# Altium footprint library 方林 封装库.PcbLib: 101 footprints (part 4 of 7)
Each footprint in its own frame and in the unit in brackets; x right, y up, seen from the top. Pads: shape width x height; smd on the part's side, far side on the other; paste and mask are expansions set on the pad; w line width, h text height; cw(c..) or ccw(c..) is an arc to the next point about the centre after c.
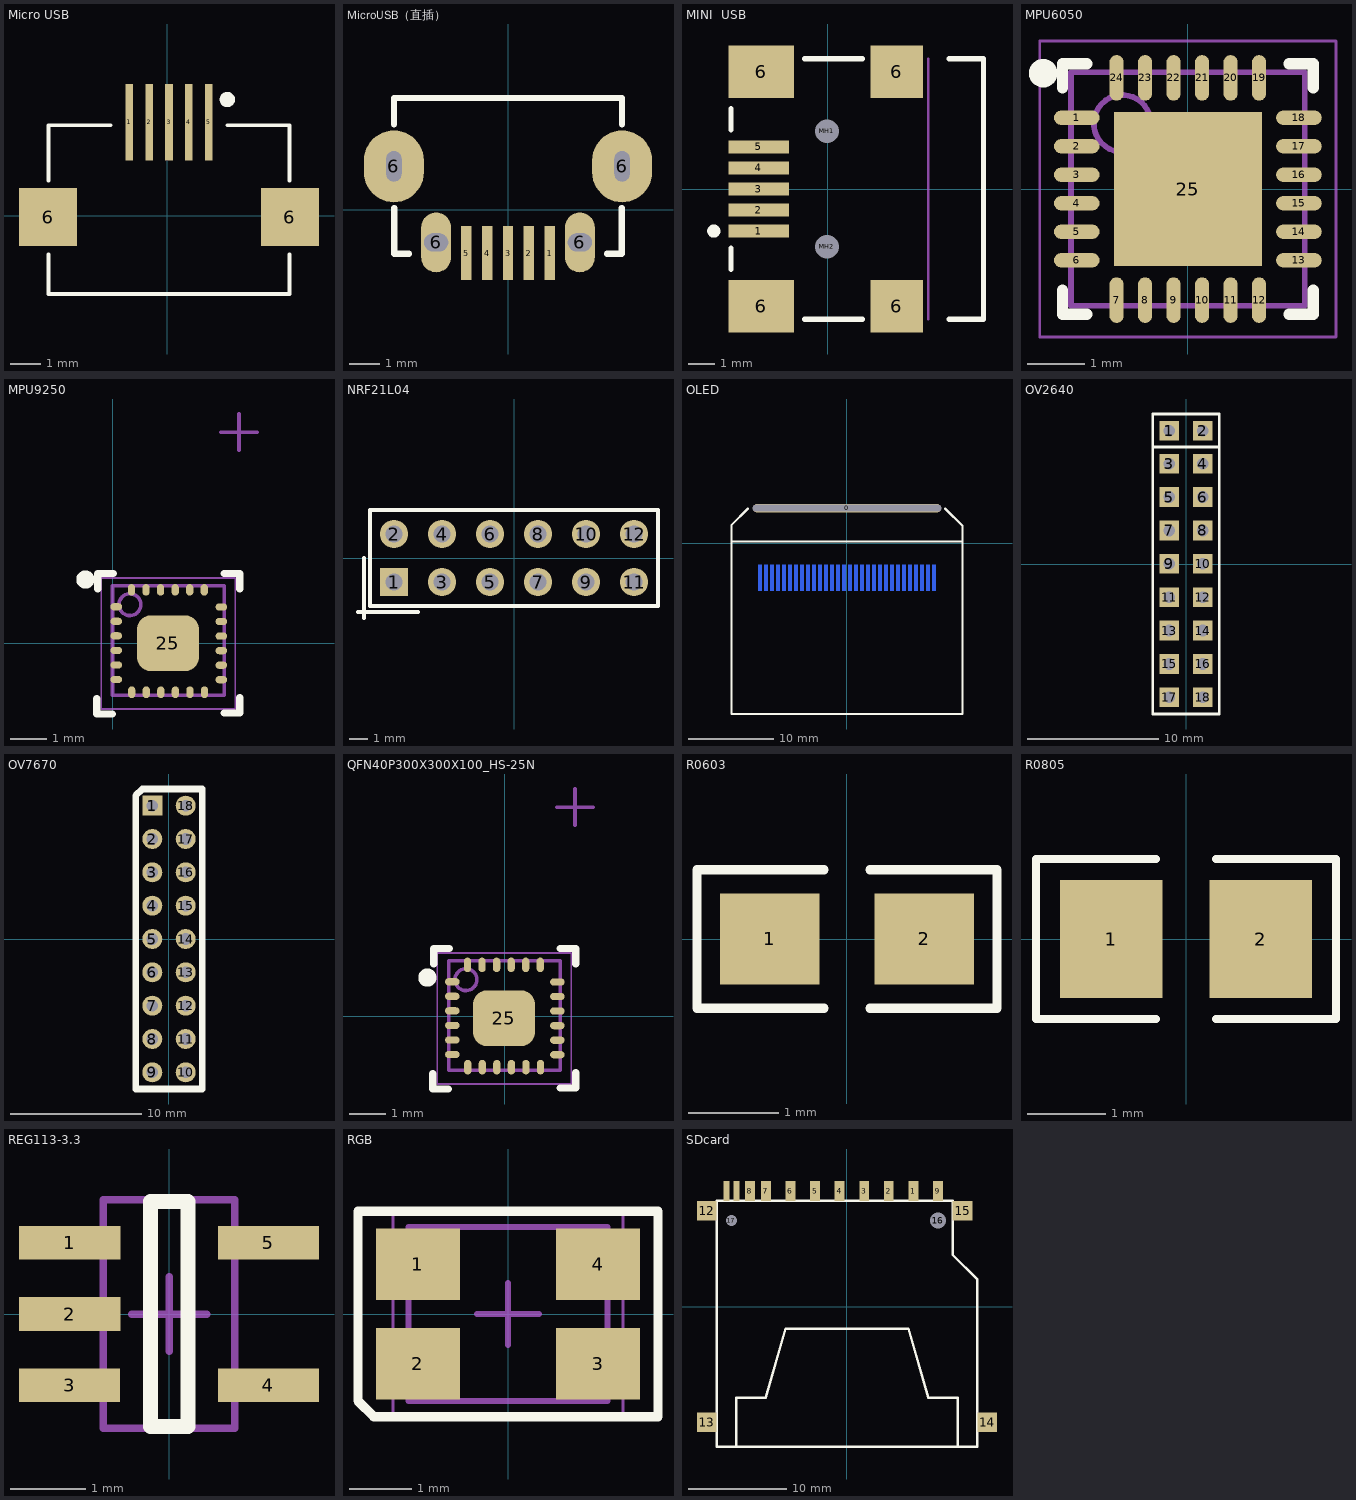
[diagram p3: the footprints below, top view; thin cyan lines are the x and y axes]

## M3过孔 [mm]
via 3.246,1.996 diameter 5.08 hole 3.251

## Micro USB [mm]
pads (7):
  rect 0.25x2.5 smd: 1(-1.236,3.044) 2(-0.586,3.044) 3(0.064,3.044) 4(0.714,3.044) 5(1.364,3.044)
  rect 1.9x1.9 smd: 6(-3.886,-0.051) 6(4.014,-0.051)
Top Overlay:
  circle w0.25: c1.969,3.792 r0.125
  lines w0.127: -3.873,-2.556 -3.873,-1.27 ; -3.873,1.144 -3.873,2.952 ; -3.836,-2.556 3.964,-2.556 ; -3.836,2.952 -1.841,2.952 ; 1.969,2.952 3.964,2.952 ; 4.001,-2.556 4.001,-1.27 ; 4.001,1.144 4.001,2.952
3D body "Micro USB.STP": height 2.71, standoff -0.23, extent -3.939,-2.628 4.041,2.802

## MicroUSB（直插） [mm]
pads (9):
  rect 0.35x1.8 smd: 1(1.4,-1.45) 2(0.7,-1.45) 3(0,-1.45) 4(-0.7,-1.45) 5(-1.4,-1.45)
  oval 2x2.4 hole 0.508 slot 1.016 at 90 deg unplated: 6(-3.81,1.45) 6(3.81,1.45)
  oval 1x2 hole 0.6 slot 0.8 at 0 deg: 6(-2.4,-1.09) 6(2.4,-1.09)
Top Overlay:
  lines w0.203: -3.81,2.847 -3.81,3.736 3.81,3.736 3.81,2.847 ; -3.8,0.053 -3.8,-1.471 -3.302,-1.471 ; 3.302,-1.471 3.8,-1.471 3.8,0.053
3D body: height 1.27, standoff 0, extent -3.785,-1.93 3.835,3.708

## MINI  USB [mm]
pads (11):
  rect 2.3x0.5 smd: 1(-2.625,-1.6) 2(-2.625,-0.8) 3(-2.625,0) 4(-2.625,0.8) 5(-2.625,1.6)
  rect 2.5x2 smd: 6(-2.525,-4.45) 6(-2.525,4.45)
  rect 2x2 smd: 6(2.625,-4.45) 6(2.625,4.45)
  round 0.6 hole 0.9 unplated: MH1(-0.025,2.2) MH2(-0.025,-2.2)
Top Overlay:
  circle w0.25: c-4.325,-1.6 r0.125
  lines w0.2: -3.675,-3.05 -3.675,-2.25 ; -3.675,2.25 -3.675,3.05 ; -0.875,-4.95 1.325,-4.95 ; -0.875,4.95 1.325,4.95 ; 4.625,-4.95 5.925,-4.95 5.925,4.95 4.625,4.95
Mechanical 1:
  lines w0.1: 3.825,-4.95 3.825,4.95
  text "PCB Edge" at 5.657,-4.036 h0.25
3D body "User Library-USB_mini_B.STEP": height 3.95, standoff -1, extent -3.325,-5.35 5.875,5.35

## MPU6050 [mm]
pads (25):
  oval 0.8x0.25 smd: 1(-1.95,1.25) 2(-1.95,0.75) 3(-1.95,0.25) 4(-1.95,-0.25) 5(-1.95,-0.75) 6(-1.95,-1.25) 13(1.95,-1.25) 14(1.95,-0.75) 15(1.95,-0.25) 16(1.95,0.25) 17(1.95,0.75) 18(1.95,1.25)
  oval 0.25x0.8 smd: 7(-1.25,-1.95) 8(-0.75,-1.95) 9(-0.25,-1.95) 10(0.25,-1.95) 11(0.75,-1.95) 12(1.25,-1.95) 19(1.25,1.95) 20(0.75,1.95) 21(0.25,1.95) 22(-0.25,1.95) 23(-0.75,1.95) 24(-1.25,1.95)
  rect 2.6x2.7 smd: 25(0,0)
Top Overlay:
  circle w0.25: c-2.54,2.032 r0.125
  lines w0.2: -2.2,-1.775 -2.2,-2.2 -1.775,-2.2 ; -2.2,1.775 -2.2,2.2 -1.775,2.2 ; 1.775,-2.2 2.2,-2.2 2.2,-1.775 ; 1.775,2.2 2.2,2.2 2.2,1.775
Mechanical 13:
  circle w0.1: c-1.15,1.15 r0.5
  lines w0.1: -2.05,-2.05 -2.05,2.05 2.05,2.05 2.05,-2.05 -2.05,-2.05
Mechanical 15:
  lines w0.05: -2.6,-2.6 -2.6,2.6 2.6,2.6 2.6,-2.6 -2.6,-2.6
  lines w0.1: -0.5,0 0.5,0 ; 0,-0.5 0,0.5
3D body: height 0.8, standoff 0.01, extent -2.05,-2.05 2.05,2.05

## MPU9250 [mm]
pads (25):
  oval 0.32x0.2 smd: 1(0.102,1.003) 2(0.102,0.603) 3(0.102,0.203) 4(0.102,-0.197) 5(0.102,-0.597) 6(0.102,-0.997) 13(2.991,-1.003) 14(2.991,-0.603) 15(2.991,-0.203) 16(2.991,0.197) 17(2.991,0.597) 18(2.991,0.997)
  oval 0.2x0.32 smd: 7(0.521,1.468) 8(0.921,1.468) 9(1.321,1.468) 10(1.721,1.468) 11(2.121,1.468) 12(2.527,-1.346) 19(2.521,1.468) 20(2.127,-1.346) 21(1.727,-1.346) 22(1.327,-1.346) 23(0.927,-1.346) 24(0.527,-1.346)
  rrect50% 1.7x1.54 smd: 25(1.524,0)
Top Overlay:
  circle w0.25: c-0.748,1.753 r0.125
  lines w0.2: -0.434,-1.521 -0.434,-1.946 -0.009,-1.946 ; -0.408,1.496 -0.408,1.921 0.017,1.921 ; 3.07,-1.921 3.495,-1.921 3.495,-1.496 ; 3.07,1.921 3.495,1.921 3.495,1.496
Mechanical 13:
  circle w0.1: c0.477,1.061 r0.3
  lines w0.1: 0,-1.43 0,1.578 3.073,1.578 3.073,-1.43 0,-1.43
Mechanical 15:
  lines w0.05: -0.311,-1.809 -0.311,1.798 3.372,1.798 3.372,-1.809 -0.311,-1.809
  lines w0.1: 2.978,5.805 3.978,5.805 ; 3.478,5.305 3.478,6.305
3D body: height 0.6, standoff 0.02, extent 0,-1.448 3.073,1.575

## NRF21L04 [mm]
pads (12):
  rect 1.5x1.5 hole 0.9: 1(-6.35,-1.27)
  round 1.5 hole 0.9: 2(-6.35,1.27) 3(-3.81,-1.27) 4(-3.81,1.27) 5(-1.27,-1.27) 6(-1.27,1.27) 7(1.27,-1.27) 8(1.27,1.27) 9(3.81,-1.27) 10(3.81,1.27) 11(6.35,-1.27) 12(6.35,1.27)
Top Overlay:
  lines w0.2: -7.62,-2.54 7.62,-2.54 7.62,2.54 -7.62,2.54 -7.62,-2.54
  lines w0.203: -8.255,-2.857 -5.08,-2.857 ; -7.938,-3.175 -7.938,0
3D body "RF2401.STEP": height 57.51, standoff -4.96, extent -8.5,-2.54 8.5,31.46

## OLED [mm]
pads (31):
  oval 22x1 hole 0.762 slot 22 at 0 deg: 0(0,4.063)
  rect 0.4x3 smd far side: 1(10.15,-4.062) 2(9.45,-4.062) 3(8.75,-4.062) 4(8.05,-4.062) 5(7.35,-4.062) 6(6.65,-4.062) 7(5.95,-4.062) 8(5.25,-4.062) 9(4.55,-4.062) 10(3.85,-4.062) 11(3.15,-4.062) 12(2.45,-4.062) 13(1.75,-4.062) 14(1.05,-4.062) 15(0.35,-4.062) 16(-0.35,-4.062) 17(-1.05,-4.062) 18(-1.75,-4.062) 19(-2.45,-4.062) 20(-3.15,-4.062) 21(-3.85,-4.062) 22(-4.55,-4.062) 23(-5.25,-4.062) 24(-5.95,-4.062) 25(-6.65,-4.062) 26(-7.35,-4.062) 27(-8.05,-4.062) 28(-8.75,-4.062) 29(-9.45,-4.062) 30(-10.15,-4.062)
Top Overlay:
  lines w0.254: -11.55,4.038 -13.5,2.088 -13.5,0.188 ; 11.45,4.038 13.5,1.988 13.5,0.188 ; 13.5,-7.412 13.5,-5.912 ; -13.5,0.188 13.5,0.188 ; -13.5,0.188 -13.5,-19.962 13.5,-19.962 13.5,0.188
Bottom Overlay:
  lines w0.2: -10.95,-3.892 -10.65,-3.892 -10.65,-2.08 10.65,-2.08 10.65,-3.892 10.95,-3.892 10.95,0.256 8.098,3.108 5.998,3.108 -5.902,3.108 -8.002,3.108 -10.95,0.159 -10.95,-3.892

## OV2640 [mm]
pads (18):
  rect 1.5x1.5 hole 0.9: 1(-1.27,10.147) 2(1.27,10.147) 3(-1.27,7.633) 4(1.27,7.633) 5(-1.27,5.093) 6(1.27,5.093) 7(-1.27,2.553) 8(1.27,2.553) 9(-1.27,0.013) 10(1.27,0.013) 11(-1.27,-2.527) 12(1.27,-2.527) 13(-1.27,-5.067) 14(1.27,-5.067) 15(-1.27,-7.607) 16(1.27,-7.607) 17(-1.27,-10.147) 18(1.27,-10.147)
Top Overlay:
  lines w0.2: -2.54,-11.417 2.54,-11.417 2.54,8.903 -2.54,8.903 -2.54,-11.417 ; -2.54,8.877 -2.54,11.417 2.54,11.417 2.54,8.877 -2.54,8.877
3D body: height 17, standoff 12, extent -15.799,-3.823 -15.494,3.315
3D body: height 18, standoff 11, extent -15.573,-4.318 -14.938,4.09
3D body: height 16, standoff 13, extent -14.986,-3.188 -4.064,2.502
3D body: height 18, standoff 10, extent -4.013,-5.321 -0.381,5.22
3D body: height 19, standoff 2, extent -0.457,-11.443 0.432,11.417
3D body "HEADER.STEP": height 7.58, standoff -2.94, extent 0,8.877 2.54,11.417
3D body "HEADER.STEP": height 7.58, standoff -2.94, extent -2.54,8.877 0,11.417
3D body "HEADER.STEP": height 7.58, standoff -2.94, extent 0,6.363 2.54,8.903
3D body "HEADER.STEP": height 7.58, standoff -2.94, extent -2.54,6.363 0,8.903
3D body "HEADER.STEP": height 7.58, standoff -2.94, extent -2.54,3.823 0,6.363
3D body "HEADER.STEP": height 7.58, standoff -2.94, extent 0,3.823 2.54,6.363
3D body "HEADER.STEP": height 7.58, standoff -2.94, extent 0,1.283 2.54,3.823
3D body "HEADER.STEP": height 7.58, standoff -2.94, extent -2.54,1.283 0,3.823
3D body "HEADER.STEP": height 7.58, standoff -2.94, extent -2.54,-1.257 0,1.283
3D body "HEADER.STEP": height 7.58, standoff -2.94, extent 0,-1.257 2.54,1.283
3D body "HEADER.STEP": height 7.58, standoff -2.94, extent 0,-3.797 2.54,-1.257
3D body "HEADER.STEP": height 7.58, standoff -2.94, extent -2.54,-3.797 0,-1.257
3D body "HEADER.STEP": height 7.58, standoff -2.94, extent -2.54,-6.337 0,-3.797
3D body "HEADER.STEP": height 7.58, standoff -2.94, extent 0,-6.337 2.54,-3.797
3D body "HEADER.STEP": height 7.58, standoff -2.94, extent 0,-8.877 2.54,-6.337
3D body "HEADER.STEP": height 7.58, standoff -2.94, extent 0,-11.417 2.54,-8.877
3D body "HEADER.STEP": height 7.58, standoff -2.94, extent -2.54,-8.877 0,-6.337
3D body "HEADER.STEP": height 7.58, standoff -2.94, extent -2.54,-11.417 0,-8.877

## OV7670 [mil]
pads (18):
  rect 60x60 hole 35.43: 1(-50,400)
  round 60 hole 35.43: 2(-50,300) 3(-50,200) 4(-50,100) 5(-50,0) 6(-50,-100) 7(-50,-200) 8(-50,-300) 9(-50,-400) 10(50,-400) 11(50,-300) 12(50,-200) 13(50,-100) 14(50,0) 15(50,100) 16(50,200) 17(50,300) 18(50,400)
Top Overlay:
  lines w20: -100,-450 -100,430 -80,450 100,450 100,-400 100,-450 -100,-450

## QFN40P300X300X100_HS-25N [mm] "QFN, 24-Leads, Body 3.00x3.00mm, Pitch 0.40mm, Thermal Pad 1.54x1.70mm, IPC Medium Density"
height 1
pads (25):
  oval 0.4x0.2 smd: 1(-1.445,0.942) 2(-1.445,0.542) 3(-1.445,0.142) 4(-1.445,-0.258) 5(-1.445,-0.658) 6(-1.445,-1.058) 13(1.445,-1.064) 14(1.445,-0.664) 15(1.445,-0.264) 16(1.445,0.136) 17(1.445,0.536) 18(1.445,0.936)
  oval 0.2x0.4 smd: 7(-1.025,1.407) 8(-0.625,1.407) 9(-0.225,1.407) 10(0.175,1.407) 11(0.575,1.407) 12(0.981,-1.407) 19(0.975,1.407) 20(0.581,-1.407) 21(0.181,-1.407) 22(-0.219,-1.407) 23(-0.619,-1.407) 24(-1.019,-1.407)
  rrect50% 1.7x1.54 smd: 25(-0.022,-0.061)
Top Overlay:
  circle w0.25: c-2.131,1.057 r0.125
  lines w0.2: -1.98,-1.582 -1.98,-2.007 -1.555,-2.007 ; -1.955,1.435 -1.955,1.86 -1.53,1.86 ; 1.524,-1.981 1.949,-1.981 1.949,-1.556 ; 1.524,1.86 1.949,1.86 1.949,1.435
Mechanical 13:
  circle w0.1: c-1.07,1.001 r0.3
  lines w0.1: -1.546,-1.491 1.527,-1.491 1.527,1.517 -1.546,1.517 -1.546,-1.491
Mechanical 15:
  lines w0.05: -1.857,-1.87 1.826,-1.87 1.826,1.737 -1.857,1.737 -1.857,-1.87
  lines w0.1: 1.431,5.745 2.431,5.745 ; 1.931,5.245 1.931,6.245
3D body: height 0.6, standoff 0.02, extent -1.546,-1.509 1.527,1.514

## R0603 [mm]
pads (2):
  rect 1.1x1 smd: 1(-0.85,0) 2(0.85,0)
Top Overlay:
  lines w0.1: -0.254,-0.762 -1.651,-0.762 -1.651,0.762 -0.254,0.762 ; 0.254,-0.762 1.651,-0.762 1.651,0.762 0.254,0.762
3D body "R0603.STEP": height 0.45, standoff 0, extent -0.8,-0.4 0.8,0.4

## R0805 [mm]
pads (2):
  rect 1.3x1.5 smd: 1(-0.95,0) 2(0.95,0)
Top Overlay:
  lines w0.1: -0.381,-1.016 -1.905,-1.016 -1.905,1.016 -0.381,1.016 ; 0.381,-1.016 1.905,-1.016 1.905,1.016 0.381,1.016
3D body: height 0.51, standoff 0, extent -1.143,-0.508 -1.016,0.508
3D body: height 0.51, standoff 0, extent 1.016,-0.508 1.143,0.508
3D body "R0805.STEP": height 0.55, standoff 0, extent -1,-0.63 1,0.63

## REG113-3.3 [mm]
pads (5):
  rect 1.35x0.45 smd: 1(-1.325,0.95) 2(-1.325,0) 3(-1.325,-0.95) 4(1.325,-0.95) 5(1.325,0.95)
Top Overlay:
  lines w0.2: -0.25,-1.5 0.25,-1.5 0.25,1.5 -0.25,1.5 -0.25,-1.5
Mechanical 13:
  lines w0.1: -0.875,-1.525 -0.875,1.525 0.875,1.525 0.875,-1.525 -0.875,-1.525
Mechanical 15:
  lines w0.1: -0.5,0 0.5,0 ; 0,-0.5 0,0.5
3D body: height 1.45, standoff 0.15, extent -0.875,-1.525 0.875,1.525

## RGB [mm]
pads (4):
  rect 1.35x1.15 smd: 1(-1.45,0.8) 2(-1.45,-0.8) 3(1.45,-0.8) 4(1.45,0.8)
Top Overlay:
  lines w0.152: -2.413,-1.397 -2.413,1.651 2.413,1.651 2.413,-1.651 -2.159,-1.651 -2.413,-1.397
Mechanical 13:
  lines w0.1: -1.6,-1.4 -1.6,1.4 1.6,1.4 1.6,-1.4 -1.6,-1.4
Mechanical 15:
  lines w0.05: -1.85,-1.65 -1.85,1.65 1.85,1.65 1.85,-1.65 -1.85,-1.65
  lines w0.1: -0.5,0 0.5,0 ; 0,-0.5 0,0.5
3D body: height 0.76, standoff 0, extent -1.6,-1.4 1.6,1.4
3D body: height 0.97, standoff 0.94, extent -1.016,-1.016 0,0
3D body: height 0.97, standoff 0.94, extent -1.016,0 0,1.016
3D body: height 0.97, standoff 0.94, extent 0,-1.016 1.016,0
3D body: height 0.97, standoff 0.94, extent 0,0 1.016,1.016
3D body: height 0.91, standoff 0.79, extent -1.016,-1.016 1.016,1.016
3D body: height 0.89, standoff 0.76, extent -1.6,-1.397 1.6,1.397

## SDcard [mm]
pads (17):
  rect 1x2 smd: 1(6.75,11.75) 2(4.25,11.75) 3(1.75,11.75) 4(-0.75,11.75) 5(-3.25,11.75) 6(-5.75,11.75) 7(-8.25,11.75) 8(-9.875,11.75) 9(9.25,11.75)
  rect 0.6x2 smd: 10(-11.25,11.75) 11(-12.25,11.75)
  rect 2x2 smd: 12(-14.25,9.75) 13(-14.25,-11.75) 14(14.25,-11.75) 15(11.75,9.75)
  round 1.5 hole 1.6: 16(9.25,8.75)
  round 1 hole 1.1: 17(-11.75,8.75)
Top Overlay:
  lines w0.254: -11.25,-14.25 -11.25,-9.25 -8.25,-9.25 -6.25,-2.25 6.25,-2.25 8.25,-9.25 11.25,-9.25 11.25,-14.25 ; -13.25,-14.25 -13.25,10.75 10.75,10.75 10.75,5.25 13.25,2.75 13.25,-14.25 -13.25,-14.25
3D body "User Library-2041021-4.step": height 3.32, standoff -0.58, extent -14.103,-14.297 13.872,11.953